# Altium footprint library domino-rising-cage-clamp.PcbLib: 435 footprints (part 12 of 28)
Each footprint in its own frame and in the unit in brackets; x right, y up, seen from the top. Pads: shape width x height; smd on the part's side, far side on the other; paste and mask are expansions set on the pad; w line width, h text height; cw(c..) or ccw(c..) is an arc to the next point about the centre after c.
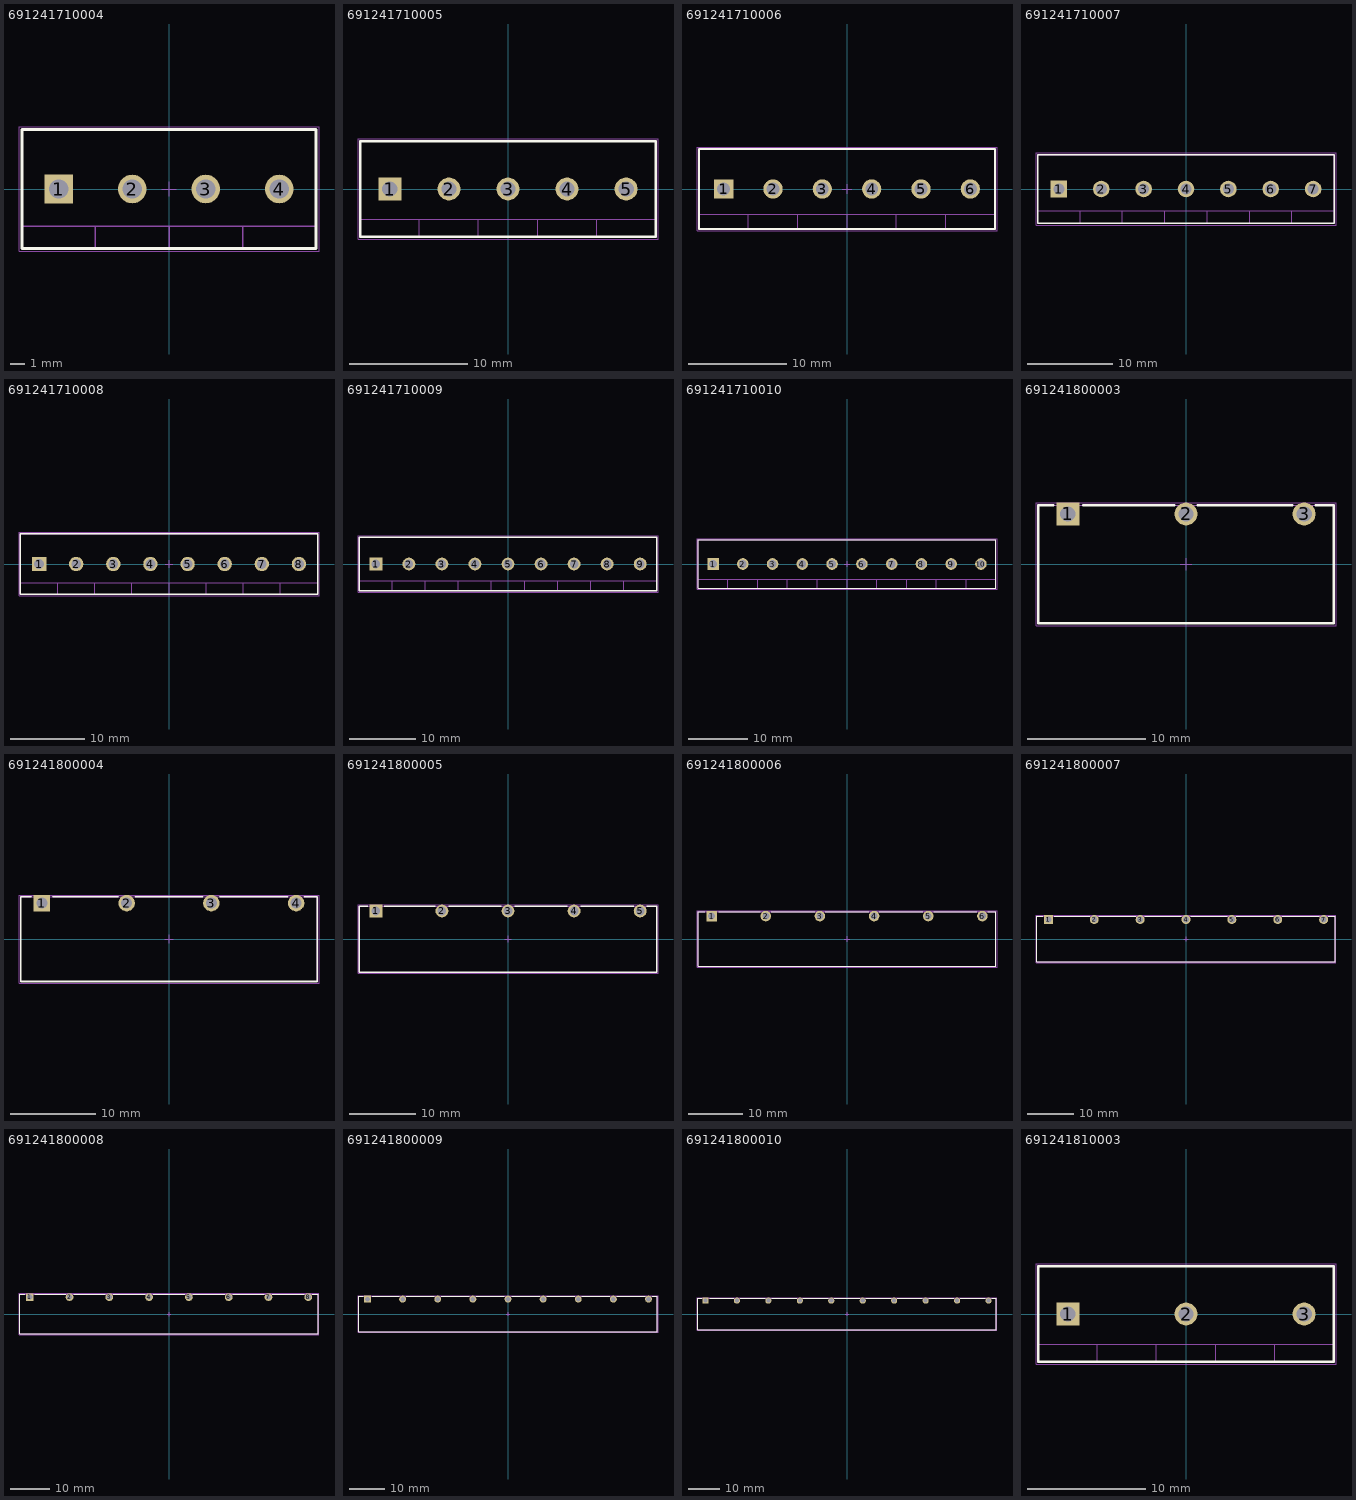
[diagram p11: the footprints below, top view; thin cyan lines are the x and y axes]

## 691241710004 [mm] "Serie 2417 - 5.00 mm _ 4 pins"
height 10
pads (4):
  rect 1.95x1.95 hole 1.3: 1(-7.5,0)
  round 1.95 hole 1.3: 2(-2.5,0) 3(2.5,0) 4(7.5,0)
Top Overlay:
  lines w0.2: -10,-4.05 -10,4.05 10,4.05 10,-4.05 -10,-4.05
Mechanical 13:
  lines w0.1: -10,-2.55 10,-2.55 ; -5,-4.05 -5,-2.55 ; 0,-4.05 0,-2.55 ; 5,-4.05 5,-2.55 ; -10,-4.05 10,-4.05 10,4.05 -10,4.05 -10,-4.05
Mechanical 15:
  lines w0.05: -0.5,0 0.5,0 ; 0,-0.5 0,0.5 ; -10.2,-4.25 -10.2,4.25 10.2,4.25 10.2,-4.25 -10.2,-4.25
3D body "691241710004.stp": height 10.1, standoff -3.4, extent -10,-4.05 10,4.05

## 691241710005 [mm] "Serie 2417 - 5.00 mm _ 5 pins"
height 10
pads (5):
  rect 1.95x1.95 hole 1.3: 1(-10,0)
  round 1.95 hole 1.3: 2(-5,0) 3(0,0) 4(5,0) 5(10,0)
Top Overlay:
  lines w0.2: -12.5,-4.05 -12.5,4.05 12.5,4.05 12.5,-4.05 -12.5,-4.05
Mechanical 13:
  lines w0.1: -12.5,-2.55 12.5,-2.55 ; -7.5,-4.05 -7.5,-2.55 ; -2.5,-4.05 -2.5,-2.55 ; 2.5,-4.05 2.5,-2.55 ; 7.5,-4.05 7.5,-2.55 ; -12.5,-4.05 12.5,-4.05 12.5,4.05 -12.5,4.05 -12.5,-4.05
Mechanical 15:
  lines w0.05: -0.5,0 0.5,0 ; 0,-0.5 0,0.5 ; -12.7,-4.25 -12.7,4.25 12.7,4.25 12.7,-4.25 -12.7,-4.25
3D body "691241710005.stp": height 10.1, standoff -3.4, extent -12.5,-4.05 12.5,4.05

## 691241710006 [mm] "Serie 2417 - 5.00 mm _ 6 pins"
height 10
pads (6):
  rect 1.95x1.95 hole 1.3: 1(-12.5,0)
  round 1.95 hole 1.3: 2(-7.5,0) 3(-2.5,0) 4(2.5,0) 5(7.5,0) 6(12.5,0)
Top Overlay:
  lines w0.2: -15,-4.05 15,-4.05 15,4.05 -15,4.05 -15,-4.05
Mechanical 13:
  lines w0.1: -15,-2.55 15,-2.55 ; -10,-4.05 -10,-2.55 ; -5,-4.05 -5,-2.55 ; 0,-4.05 0,-2.55 ; 5,-4.05 5,-2.55 ; 10,-4.05 10,-2.55 ; -15,-4.05 -15,4.05 15,4.05 15,-4.05 -15,-4.05
Mechanical 15:
  lines w0.05: -0.5,0 0.5,0 ; 0,-0.5 0,0.5 ; -15.2,-4.25 15.2,-4.25 15.2,4.25 -15.2,4.25 -15.2,-4.25
3D body "691241710006.stp": height 10.1, standoff -3.4, extent -15,-4.05 15,4.05

## 691241710007 [mm] "Serie 2417 - 5.00 mm _ 7 pins"
height 10
pads (7):
  rect 1.95x1.95 hole 1.3: 1(-15,0)
  round 1.95 hole 1.3: 2(-10,0) 3(-5,0) 4(0,0) 5(5,0) 6(10,0) 7(15,0)
Top Overlay:
  lines w0.2: -17.5,-4.05 -17.5,4.05 17.5,4.05 17.5,-4.05 -17.5,-4.05
Mechanical 13:
  lines w0.1: -17.5,-2.55 17.5,-2.55 ; -12.5,-4.05 -12.5,-2.55 ; -7.5,-4.05 -7.5,-2.55 ; -2.5,-4.05 -2.5,-2.55 ; 2.5,-4.05 2.5,-2.55 ; 7.5,-4.05 7.5,-2.55 ; 12.5,-4.05 12.5,-2.55 ; -17.5,-4.05 17.5,-4.05 17.5,4.05 -17.5,4.05 -17.5,-4.05
Mechanical 15:
  lines w0.05: -0.5,0 0.5,0 ; 0,-0.5 0,0.5 ; -17.7,-4.25 -17.7,4.25 17.7,4.25 17.7,-4.25 -17.7,-4.25
3D body "691241710007.stp": height 10.1, standoff -3.4, extent -17.5,-4.05 17.5,4.05

## 691241710008 [mm] "Serie 2417 - 5.00 mm _ 8 pins"
height 10
pads (8):
  rect 1.95x1.95 hole 1.3: 1(-17.5,0)
  round 1.95 hole 1.3: 2(-12.5,0) 3(-7.5,0) 4(-2.5,0) 5(2.5,0) 6(7.5,0) 7(12.5,0) 8(17.5,0)
Top Overlay:
  lines w0.2: -20,-4.05 20,-4.05 20,4.05 -20,4.05 -20,-4.05
Mechanical 13:
  lines w0.1: -20,-2.55 20,-2.55 ; -15,-4.05 -15,-2.55 ; -10,-4.05 -10,-2.55 ; -5,-4.05 -5,-2.55 ; 0,-4.05 0,-2.55 ; 5,-4.05 5,-2.55 ; 10,-4.05 10,-2.55 ; 15,-4.05 15,-2.55 ; -20,-4.05 -20,4.05 20,4.05 20,-4.05 -20,-4.05
Mechanical 15:
  lines w0.05: -0.5,0 0.5,0 ; 0,-0.5 0,0.5 ; -20.2,-4.25 20.2,-4.25 20.2,4.25 -20.2,4.25 -20.2,-4.25
3D body "691241710008.stp": height 10.1, standoff -3.4, extent -20,-4.05 20,4.05

## 691241710009 [mm] "Serie 2417 - 5.00 mm _ 9 pins"
height 10
pads (9):
  rect 1.95x1.95 hole 1.3: 1(-20,0)
  round 1.95 hole 1.3: 2(-15,0) 3(-10,0) 4(-5,0) 5(0,0) 6(5,0) 7(10,0) 8(15,0) 9(20,0)
Top Overlay:
  lines w0.2: -22.5,-4.05 -22.5,4.05 22.5,4.05 22.5,-4.05 -22.5,-4.05
Mechanical 13:
  lines w0.1: -22.5,-2.55 22.5,-2.55 ; -17.5,-4.05 -17.5,-2.55 ; -12.5,-4.05 -12.5,-2.55 ; -7.5,-4.05 -7.5,-2.55 ; -2.5,-4.05 -2.5,-2.55 ; 2.5,-4.05 2.5,-2.55 ; 7.5,-4.05 7.5,-2.55 ; 12.5,-4.05 12.5,-2.55 ; 17.5,-4.05 17.5,-2.55 ; -22.5,-4.05 22.5,-4.05 22.5,4.05 -22.5,4.05 -22.5,-4.05
Mechanical 15:
  lines w0.05: -0.5,0 0.5,0 ; 0,-0.5 0,0.5 ; -22.7,-4.25 -22.7,4.25 22.7,4.25 22.7,-4.25 -22.7,-4.25
3D body "691241710009.stp": height 10.1, standoff -3.4, extent -22.5,-4.05 22.5,4.05

## 691241710010 [mm] "Serie 2417 - 5.00 mm _ 10 pins"
height 10
pads (10):
  rect 1.95x1.95 hole 1.3: 1(-22.5,0)
  round 1.95 hole 1.3: 2(-17.5,0) 3(-12.5,0) 4(-7.5,0) 5(-2.5,0) 6(2.5,0) 7(7.5,0) 8(12.5,0) 9(17.5,0) 10(22.5,0)
Top Overlay:
  lines w0.2: -25,-4.05 25,-4.05 25,4.05 -25,4.05 -25,-4.05
Mechanical 13:
  lines w0.1: -25,-2.55 25,-2.55 ; -20,-4.05 -20,-2.55 ; -15,-4.05 -15,-2.55 ; -10,-4.05 -10,-2.55 ; -5,-4.05 -5,-2.55 ; 0,-4.05 0,-2.55 ; 5,-4.05 5,-2.55 ; 10,-4.05 10,-2.55 ; 15,-4.05 15,-2.55 ; 20,-4.05 20,-2.55 ; -25,-4.05 -25,4.05 25,4.05 25,-4.05 -25,-4.05
Mechanical 15:
  lines w0.05: -0.5,0 0.5,0 ; 0,-0.5 0,0.5 ; -25.2,-4.25 25.2,-4.25 25.2,4.25 -25.2,4.25 -25.2,-4.25
3D body "691241710010.stp": height 10.1, standoff -3.4, extent -25,-4.05 25,4.05

## 691241800003 [mm] "10.00mm Vertical Cable Entry with Rising Cage Clamp, 03p"
height 8.1
pads (3):
  rect 1.95x1.95 hole 1.3: 1(-10,4.25)
  round 1.95 hole 1.3: 2(0,4.25) 3(10,4.25)
Top Overlay:
  lines w0.2: -11.25,5 -12.5,5 -12.5,-5 12.5,-5 12.5,5 11,5 ; -8.7,5 -1,5 ; 1,5 9,5
Mechanical 13:
  lines w0.1: -12.5,-5 -12.5,5 12.5,5 12.5,-5 -12.5,-5
Mechanical 15:
  lines w0.05: -0.5,0 0.5,0 ; 0,-0.5 0,0.5 ; -12.7,-5.2 12.7,-5.2 12.7,5.2 -12.7,5.2 -12.7,-5.2
3D body "691241800003.stp": height 8.2, standoff -3.4, extent -12.5,-5 12.5,5

## 691241800004 [mm] "10.00mm Vertical Cable Entry with Rising Cage Clamp, 04p"
height 8.1
pads (4):
  rect 1.95x1.95 hole 1.3: 1(-15,4.25)
  round 1.95 hole 1.3: 2(-5,4.25) 3(5,4.25) 4(15,4.25)
Top Overlay:
  lines w0.2: -16.25,5 -17.5,5 -17.5,-5 17.5,-5 17.5,5 16,5 ; -13.7,5 -6,5 ; -4,5 4,5 ; 6,5 14,5
Mechanical 13:
  lines w0.1: -17.5,-5 -17.5,5 17.5,5 17.5,-5 -17.5,-5
Mechanical 15:
  lines w0.05: -0.5,0 0.5,0 ; 0,-0.5 0,0.5 ; -17.7,-5.2 17.7,-5.2 17.7,5.2 -17.7,5.2 -17.7,-5.2
3D body "691241800004.stp": height 8.2, standoff -3.4, extent -17.5,-5 17.5,5

## 691241800005 [mm] "10.00mm Vertical Cable Entry with Rising Cage Clamp, 05p"
height 8.1
pads (5):
  rect 1.95x1.95 hole 1.3: 1(-20,4.25)
  round 1.95 hole 1.3: 2(-10,4.25) 3(0,4.25) 4(10,4.25) 5(20,4.25)
Top Overlay:
  lines w0.2: -21.25,5 -22.5,5 -22.5,-5 22.5,-5 22.5,5 21,5 ; -18.7,5 -11,5 ; -9,5 -1,5 ; 1,5 9,5 ; 11,5 19,5
Mechanical 13:
  lines w0.1: -22.5,-5 22.5,-5 22.5,5 -22.5,5 -22.5,-5
Mechanical 15:
  lines w0.05: -0.5,0 0.5,0 ; 0,-0.5 0,0.5 ; -22.7,-5.2 -22.7,5.2 22.7,5.2 22.7,-5.2 -22.7,-5.2
3D body "691241800005.stp": height 8.2, standoff -3.4, extent -22.5,-5 22.5,5

## 691241800006 [mm] "10.00mm Vertical Cable Entry with Rising Cage Clamp, 06p"
height 8.1
pads (6):
  rect 1.95x1.95 hole 1.3: 1(-25,4.25)
  round 1.95 hole 1.3: 2(-15,4.25) 3(-5,4.25) 4(5,4.25) 5(15,4.25) 6(25,4.25)
Top Overlay:
  lines w0.2: -26.25,5 -27.5,5 -27.5,-5 27.5,-5 27.5,5 26,5 ; -23.7,5 -16,5 ; -14,5 -6,5 ; -4,5 4,5 ; 6,5 14,5 ; 16,5 24,5
Mechanical 13:
  lines w0.1: -27.5,-5 -27.5,5 27.5,5 27.5,-5 -27.5,-5
Mechanical 15:
  lines w0.05: -0.5,0 0.5,0 ; 0,-0.5 0,0.5 ; -27.7,-5.2 27.7,-5.2 27.7,5.2 -27.7,5.2 -27.7,-5.2
3D body "691241800006.stp": height 8.2, standoff -3.4, extent -27.5,-5 27.5,5

## 691241800007 [mm] "10.00mm Vertical Cable Entry with Rising Cage Clamp, 07p"
height 8.1
pads (7):
  rect 1.95x1.95 hole 1.3: 1(-30,4.25)
  round 1.95 hole 1.3: 2(-20,4.25) 3(-10,4.25) 4(0,4.25) 5(10,4.25) 6(20,4.25) 7(30,4.25)
Top Overlay:
  lines w0.2: -31.25,5 -32.5,5 -32.5,-5 32.5,-5 32.5,5 31,5 ; -28.7,5 -21,5 ; -19,5 -11,5 ; -9,5 -1,5 ; 1,5 9,5 ; 11,5 19,5 ; 21,5 29,5
Mechanical 13:
  lines w0.1: -32.5,-5 -32.5,5 32.5,5 32.5,-5 -32.5,-5
Mechanical 15:
  lines w0.05: -0.5,0 0.5,0 ; 0,-0.5 0,0.5 ; -32.7,-5.2 32.7,-5.2 32.7,5.2 -32.7,5.2 -32.7,-5.2
3D body "691241800007.stp": height 8.2, standoff -3.4, extent -32.5,-5 32.5,5

## 691241800008 [mm] "10.00mm Vertical Cable Entry with Rising Cage Clamp, 08p"
height 8.1
pads (8):
  rect 1.95x1.95 hole 1.3: 1(-35,4.25)
  round 1.95 hole 1.3: 2(-25,4.25) 3(-15,4.25) 4(-5,4.25) 5(5,4.25) 6(15,4.25) 7(25,4.25) 8(35,4.25)
Top Overlay:
  lines w0.2: -36.25,5 -37.5,5 -37.5,-5 37.5,-5 37.5,5 36,5 ; -33.7,5 -26,5 ; -24,5 -16,5 ; -14,5 -6,5 ; -4,5 4,5 ; 6,5 14,5 ; 16,5 24,5 ; 26,5 34,5
Mechanical 13:
  lines w0.1: -37.5,-5 -37.5,5 37.5,5 37.5,-5 -37.5,-5
Mechanical 15:
  lines w0.05: -0.5,0 0.5,0 ; 0,-0.5 0,0.5 ; -37.7,-5.2 37.7,-5.2 37.7,5.2 -37.7,5.2 -37.7,-5.2
3D body "691241800008.stp": height 8.2, standoff -3.4, extent -37.5,-5 37.5,5

## 691241800009 [mm] "10.00mm Vertical Cable Entry with Rising Cage Clamp, 09p"
height 8.1
pads (9):
  rect 1.95x1.95 hole 1.3: 1(-40,4.25)
  round 1.95 hole 1.3: 2(-30,4.25) 3(-20,4.25) 4(-10,4.25) 5(0,4.25) 6(10,4.25) 7(20,4.25) 8(30,4.25) 9(40,4.25)
Top Overlay:
  lines w0.2: -41.25,5 -42.5,5 -42.5,-5 42.5,-5 42.5,5 41,5 ; -38.7,5 -31,5 ; -29,5 -21,5 ; -19,5 -11,5 ; -9,5 -1,5 ; 1,5 9,5 ; 11,5 19,5 ; 21,5 29,5 ; 31,5 39,5
Mechanical 13:
  lines w0.1: -42.5,-5 -42.5,5 42.5,5 42.5,-5 -42.5,-5
Mechanical 15:
  lines w0.05: -0.5,0 0.5,0 ; 0,-0.5 0,0.5 ; -42.7,-5.2 42.7,-5.2 42.7,5.2 -42.7,5.2 -42.7,-5.2
3D body "691241800009.stp": height 8.2, standoff -3.4, extent -42.5,-5 42.5,5

## 691241800010 [mm] "10.00mm Vertical Cable Entry with Rising Cage Clamp, 10p"
height 8.1
pads (10):
  rect 1.95x1.95 hole 1.3: 1(-45,4.25)
  round 1.95 hole 1.3: 2(-35,4.25) 3(-25,4.25) 4(-15,4.25) 5(-5,4.25) 6(5,4.25) 7(15,4.25) 8(25,4.25) 9(35,4.25) 10(45,4.25)
Top Overlay:
  lines w0.2: -46.25,5 -47.5,5 -47.5,-5 47.5,-5 47.5,5 46,5 ; -43.7,5 -36,5 ; -34,5 -26,5 ; -24,5 -16,5 ; -14,5 -6,5 ; -4,5 4,5 ; 6,5 14,5 ; 16,5 24,5 ; 26,5 34,5 ; 36,5 44,5
Mechanical 13:
  lines w0.1: -47.5,-5 -47.5,5 47.5,5 47.5,-5 -47.5,-5
Mechanical 15:
  lines w0.05: -0.5,0 0.5,0 ; 0,-0.5 0,0.5 ; -47.7,-5.2 47.7,-5.2 47.7,5.2 -47.7,5.2 -47.7,-5.2
3D body "691241800010.stp": height 8.2, standoff -3.4, extent -47.5,-5 47.5,5

## 691241810003 [mm] "10.00mm Horizontal Cable Entry with Rising Cage Clamp, 03p"
height 10
pads (3):
  rect 1.95x1.95 hole 1.3: 1(-10,0)
  round 1.95 hole 1.3: 2(0,0) 3(10,0)
Top Overlay:
  lines w0.2: -12.5,-4.05 -12.5,4.05 12.5,4.05 12.5,-4.05 -12.5,-4.05
Mechanical 13:
  lines w0.1: -12.5,-2.55 12.5,-2.55 ; -7.5,-4.05 -7.5,-2.55 ; -2.5,-4.05 -2.5,-2.55 ; 2.5,-4.05 2.5,-2.55 ; 7.5,-4.05 7.5,-2.55 ; -12.5,-4.05 12.5,-4.05 12.5,4.05 -12.5,4.05 -12.5,-4.05
Mechanical 15:
  lines w0.05: -0.5,0 0.5,0 ; 0,-0.5 0,0.5 ; -12.7,-4.25 -12.7,4.25 12.7,4.25 12.7,-4.25 -12.7,-4.25
3D body "691241810003.stp": height 10.1, standoff -3.4, extent -12.5,-4.05 12.5,4.05